# Altium schematic symbol library TI Amplifiers and Linear Special Function Amplifier.SchLib: 708 symbols (part 33 of 34)
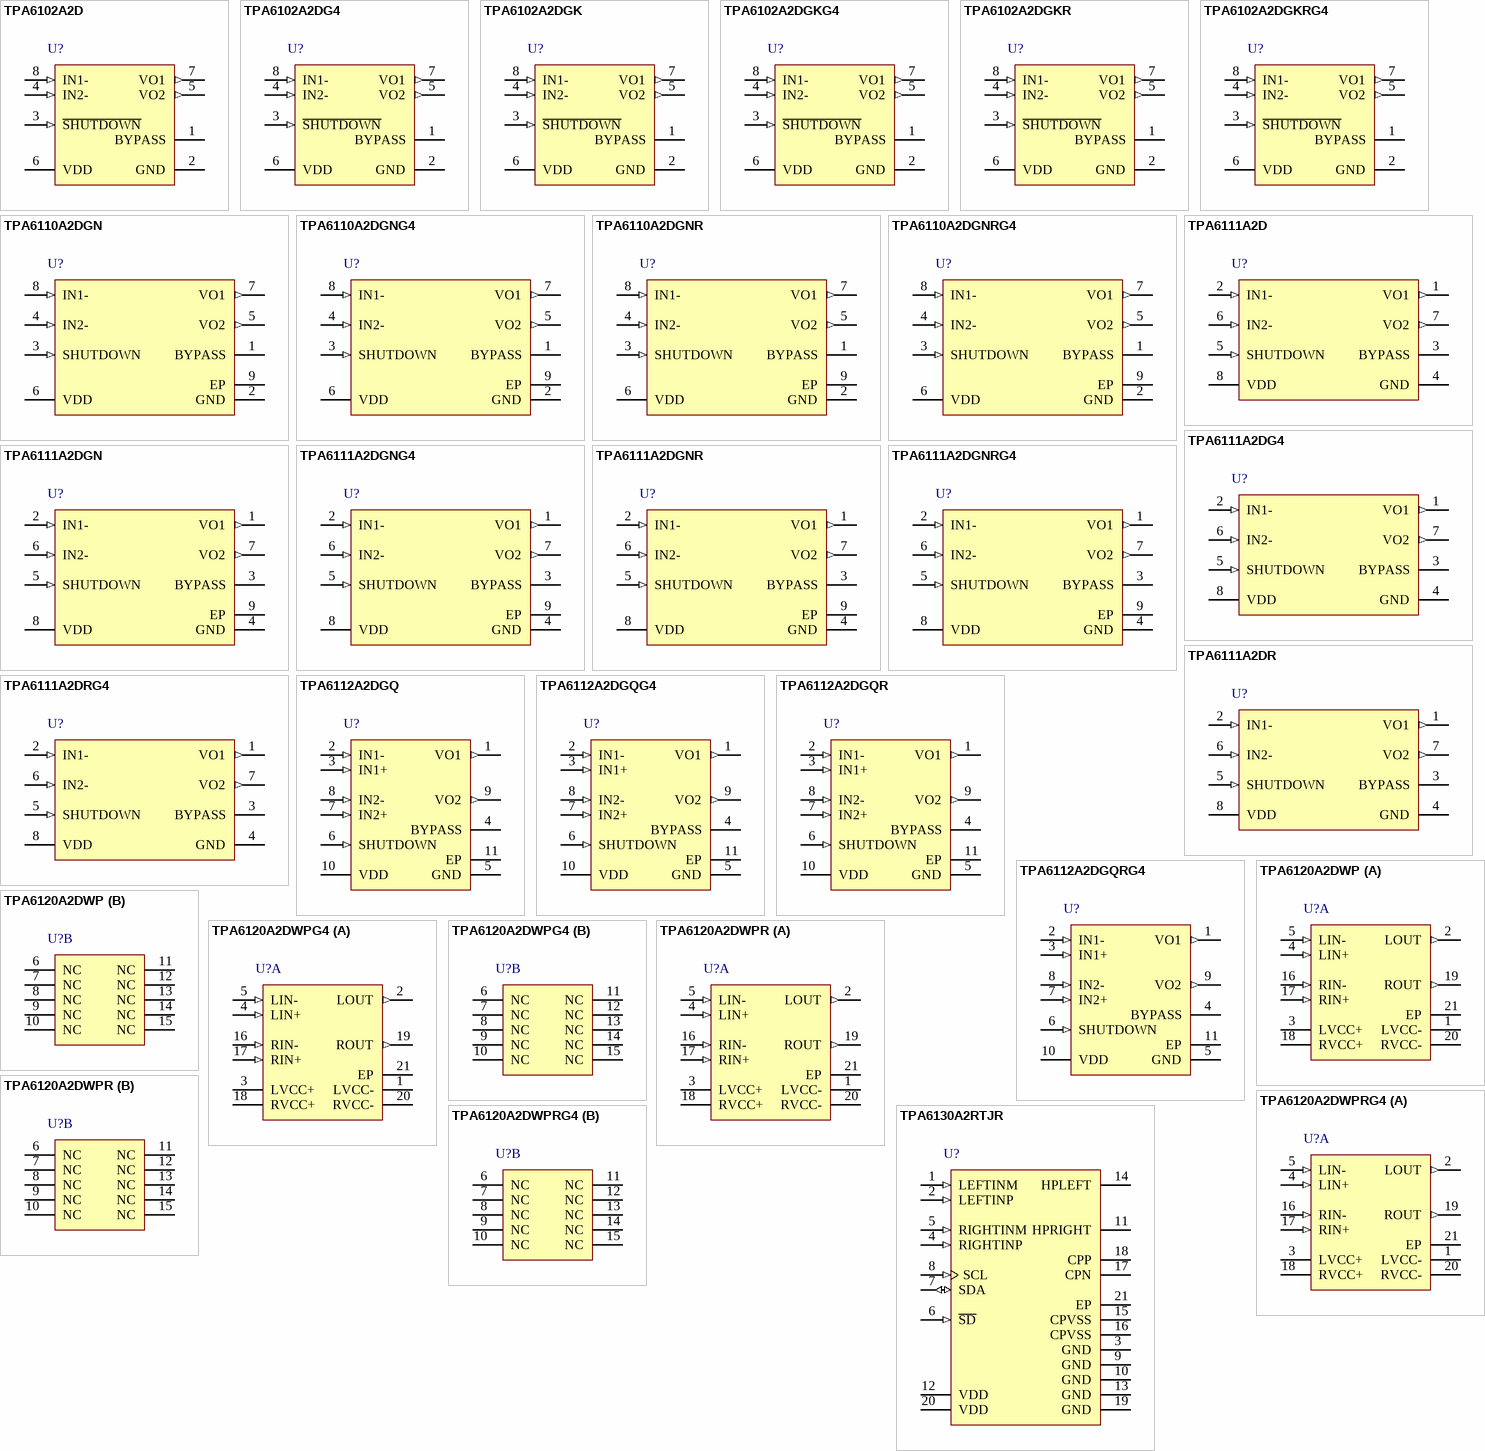
[diagram p71: symbols TPA6102A2D to TPA6130A2RTJR]

## TPA6111A2DRG4
designator U?
150-mW Stereo Headphone Audio Amplifier, Pin Compatible with LM4880 and LM4881, -40 to 85 degC, 8-pin SOIC (D8), Green (RoHS & no Sb/Br); Manufacturer: Texas Instruments; PartNumber: TPA6111A2DRG4; ISD(uA): 1; Load(Min)(ohms): 16; Output Power(W): 0.15; PSRR(dB): 70; SubFamily: Headphone Amplifier; Supply Max(Max)(Volt): 5.5; Supply Min(Min)(Volt): 2.5; DatasheetVersion: SLOS313B; PackageVersion: 4040047-3/M, 06/2011; PackageReference: D8; PackageDescription: 8-Pin Plastic Small Outline, Body 4.9 x 3.9 mm, Pitch 1.27 mm; Supplier 1: Digi-Key; Supplier Part Number 1: TPA6111A2DRG4-ND; Supplier 2: Mouser; Supplier Part Number 2: 595-TPA6111A2DRG4; Eco-Plan: Green (RoHS & no Sb/Br); Headphone Channels: Stereo; Mounting Technology: Surface Mount; Code_JEDEC: MS-012; ComponentLink1Description: Manufacturer URL; ComponentLink1URL: http://www.ti.com/; ComponentLink2Description: Datasheet; ComponentLink2URL: http://www.ti.com/general/docs/lit/getliterature.tsp?genericPartNumber=TPA6111A2&fileType=pdf; ComponentLink3Description: Package Specification; ComponentLink3URL: http://www.ti.com/litv/pdf/msoi002j
footprint TI-D8_N (SOIC, 8-Leads, Body 5x4mm, Pitch 1.27mm, IPC Medium Density)
footprint TI-D8_L (SOIC, 8-Leads, Body 5x4mm, Pitch 1.27mm, IPC High Density)
footprint TI-D8_M (SOIC, 8-Leads, Body 5x4mm, Pitch 1.27mm, IPC Low Density)
pins: 1 VO1 (out) "VO1 is the audio output for channel 1.", 2 IN1- (in) "IN1- is the inverting input for channel 1.", 3 BYPASS "Tap to voltage divider for internal mid-supply bias supply. Connect to a 0.1 uF to 1 uF low ESR capacitor for best performance.", 4 GND (power) "GND is the ground connection.", 5 SHUTDOWN (in) "Puts the device in a low quiescent current mode when held high", 6 IN2- (in) "IN2- is the inverting input for channel 2.", 7 VO2 (out) "VO2 is the audio output for channel 2.", 8 VDD (power) "VDD is the supply voltage terminal."

## TPA6112A2DGQ
designator U?
150-mW Stereo Headphone Audio Amplifier with Differential Input, -40 to 85 degC, 10-pin SOP (DGQ10), Green (RoHS & no Sb/Br); Manufacturer: Texas Instruments; PartNumber: TPA6112A2DGQ; ISD(uA): 10; Load(Min)(ohms): 16; Output Power(W): 0.15; PSRR(dB): 83; SubFamily: Headphone Amplifier; Supply Max(Max)(Volt): 5.5; Supply Min(Min)(Volt): 2.5; DatasheetVersion: SLOS342A; PackageVersion: 4073273/F, 11/2011; PackageReference: DGQ10-1675X1445TP; PackageDescription: 10-Pin Plastic Small Outline, Body 3 x 3 mm, Pitch 0.5 mm; Supplier 1: Digi-Key; Supplier Part Number 1: 296-34560-5-ND; Supplier 2: Newark; Supplier Part Number 2: 76C9849; Supplier 3: Mouser; Supplier Part Number 3: 595-TPA6112A2DGQ; Eco-Plan: Green (RoHS & no Sb/Br); Headphone Channels: Stereo; Mounting Technology: Surface Mount; Code_JEDEC: MO-187; ComponentLink1Description: Manufacturer URL; ComponentLink1URL: http://www.ti.com/; ComponentLink2Description: Datasheet; ComponentLink2URL: http://www.ti.com/general/docs/lit/getliterature.tsp?genericPartNumber=TPA6112A2&fileType=pdf; ComponentLink3Description: Package Specification; ComponentLink3URL: http://www.ti.com/litv/pdf/mpds043e
footprint TI-DGQ10-1675X1445TP_N (SOP, 10-Leads, Body 3.1x3.1mm, Pitch 0.5mm, Thermal Pad 1.88x1.57mm, IPC Medium Density)
footprint TI-DGQ10-1675X1445TP_L (SOP, 10-Leads, Body 3.1x3.1mm, Pitch 0.5mm, Thermal Pad 1.88x1.57mm, IPC High Density)
footprint TI-DGQ10-1675X1445TP_M (SOP, 10-Leads, Body 3.1x3.1mm, Pitch 0.5mm, Thermal Pad 1.88x1.57mm, IPC Low Density)
pins: 1 VO1 (out) "VO1 is the audio output for channel 1.", 2 IN1- (in) "IN1- is the negative input for channel 1.", 3 IN1+ (in) "IN1+ is the positive input for channel 1.", 4 BYPASS "Tap to voltage divider for internal mid-supply bias supply. Connect to a 0.1 uF to 1 uF low ESR capacitor for best performance.", 5 GND (power) "GND is the ground connection.", 6 SHUTDOWN (in) "Puts the device in a low quiescent current mode when held high.", 7 IN2+ (in) "IN2+ is the positive input for channel 2.", 8 IN2- (in) "IN2- is the negative input for channel 2.", 9 VO2 (out) "VO2 is the audio output for channel 2.", 10 VDD (power) "VDD is the supply voltage terminal.", 11 EP

## TPA6112A2DGQG4
designator U?
150-mW Stereo Headphone Audio Amplifier with Differential Input, -40 to 85 degC, 10-pin SOP (DGQ10), Green (RoHS & no Sb/Br); Manufacturer: Texas Instruments; PartNumber: TPA6112A2DGQG4; ISD(uA): 10; Load(Min)(ohms): 16; Output Power(W): 0.15; PSRR(dB): 83; SubFamily: Headphone Amplifier; Supply Max(Max)(Volt): 5.5; Supply Min(Min)(Volt): 2.5; DatasheetVersion: SLOS342A; PackageVersion: 4073273/F, 11/2011; PackageReference: DGQ10-1675X1445TP; PackageDescription: 10-Pin Plastic Small Outline, Body 3 x 3 mm, Pitch 0.5 mm; Supplier 1: Digi-Key; Supplier Part Number 1: TPA6112A2DGQG4-ND; Supplier 2: Newark; Supplier Part Number 2: 54K1505; Supplier 3: Mouser; Supplier Part Number 3: 595-TPA6112A2DGQG4; Eco-Plan: Green (RoHS & no Sb/Br); Headphone Channels: Stereo; Mounting Technology: Surface Mount; Code_JEDEC: MO-187; ComponentLink1Description: Manufacturer URL; ComponentLink1URL: http://www.ti.com/; ComponentLink2Description: Datasheet; ComponentLink2URL: http://www.ti.com/general/docs/lit/getliterature.tsp?genericPartNumber=TPA6112A2&fileType=pdf; ComponentLink3Description: Package Specification; ComponentLink3URL: http://www.ti.com/litv/pdf/mpds043e
footprint TI-DGQ10-1675X1445TP_N (SOP, 10-Leads, Body 3.1x3.1mm, Pitch 0.5mm, Thermal Pad 1.88x1.57mm, IPC Medium Density)
footprint TI-DGQ10-1675X1445TP_L (SOP, 10-Leads, Body 3.1x3.1mm, Pitch 0.5mm, Thermal Pad 1.88x1.57mm, IPC High Density)
footprint TI-DGQ10-1675X1445TP_M (SOP, 10-Leads, Body 3.1x3.1mm, Pitch 0.5mm, Thermal Pad 1.88x1.57mm, IPC Low Density)
pins: 1 VO1 (out) "VO1 is the audio output for channel 1.", 2 IN1- (in) "IN1- is the negative input for channel 1.", 3 IN1+ (in) "IN1+ is the positive input for channel 1.", 4 BYPASS "Tap to voltage divider for internal mid-supply bias supply. Connect to a 0.1 uF to 1 uF low ESR capacitor for best performance.", 5 GND (power) "GND is the ground connection.", 6 SHUTDOWN (in) "Puts the device in a low quiescent current mode when held high.", 7 IN2+ (in) "IN2+ is the positive input for channel 2.", 8 IN2- (in) "IN2- is the negative input for channel 2.", 9 VO2 (out) "VO2 is the audio output for channel 2.", 10 VDD (power) "VDD is the supply voltage terminal.", 11 EP

## TPA6112A2DGQR
designator U?
150-mW Stereo Headphone Audio Amplifier with Differential Input, -40 to 85 degC, 10-pin SOP (DGQ10), Green (RoHS & no Sb/Br); Manufacturer: Texas Instruments; PartNumber: TPA6112A2DGQR; ISD(uA): 10; Load(Min)(ohms): 16; Output Power(W): 0.15; PSRR(dB): 83; SubFamily: Headphone Amplifier; Supply Max(Max)(Volt): 5.5; Supply Min(Min)(Volt): 2.5; DatasheetVersion: SLOS342A; PackageVersion: 4073273/F, 11/2011; PackageReference: DGQ10-1675X1445TP; PackageDescription: 10-Pin Plastic Small Outline, Body 3 x 3 mm, Pitch 0.5 mm; Supplier 1: Digi-Key; Supplier Part Number 1: 296-10848-2-ND; Supplier 2: Digi-Key; Supplier Part Number 2: 296-10848-1-ND; Supplier 3: Digi-Key; Supplier Part Number 3: 296-10848-6-ND; Supplier 4: Newark; Supplier Part Number 4: 76C9850; Supplier 5: Mouser; Supplier Part Number 5: 595-TPA6112A2DGQR; Eco-Plan: Green (RoHS & no Sb/Br); Headphone Channels: Stereo; Mounting Technology: Surface Mount; Code_JEDEC: MO-187; ComponentLink1Description: Manufacturer URL; ComponentLink1URL: http://www.ti.com/; ComponentLink2Description: Datasheet; ComponentLink2URL: http://www.ti.com/general/docs/lit/getliterature.tsp?genericPartNumber=TPA6112A2&fileType=pdf; ComponentLink3Description: Package Specification; ComponentLink3URL: http://www.ti.com/litv/pdf/mpds043e
footprint TI-DGQ10-1675X1445TP_N (SOP, 10-Leads, Body 3.1x3.1mm, Pitch 0.5mm, Thermal Pad 1.88x1.57mm, IPC Medium Density)
footprint TI-DGQ10-1675X1445TP_L (SOP, 10-Leads, Body 3.1x3.1mm, Pitch 0.5mm, Thermal Pad 1.88x1.57mm, IPC High Density)
footprint TI-DGQ10-1675X1445TP_M (SOP, 10-Leads, Body 3.1x3.1mm, Pitch 0.5mm, Thermal Pad 1.88x1.57mm, IPC Low Density)
pins: 1 VO1 (out) "VO1 is the audio output for channel 1.", 2 IN1- (in) "IN1- is the negative input for channel 1.", 3 IN1+ (in) "IN1+ is the positive input for channel 1.", 4 BYPASS "Tap to voltage divider for internal mid-supply bias supply. Connect to a 0.1 uF to 1 uF low ESR capacitor for best performance.", 5 GND (power) "GND is the ground connection.", 6 SHUTDOWN (in) "Puts the device in a low quiescent current mode when held high.", 7 IN2+ (in) "IN2+ is the positive input for channel 2.", 8 IN2- (in) "IN2- is the negative input for channel 2.", 9 VO2 (out) "VO2 is the audio output for channel 2.", 10 VDD (power) "VDD is the supply voltage terminal.", 11 EP

## TPA6112A2DGQRG4
designator U?
150-mW Stereo Headphone Audio Amplifier with Differential Input, -40 to 85 degC, 10-pin SOP (DGQ10), Green (RoHS & no Sb/Br); Manufacturer: Texas Instruments; PartNumber: TPA6112A2DGQRG4; ISD(uA): 10; Load(Min)(ohms): 16; Output Power(W): 0.15; PSRR(dB): 83; SubFamily: Headphone Amplifier; Supply Max(Max)(Volt): 5.5; Supply Min(Min)(Volt): 2.5; DatasheetVersion: SLOS342A; PackageVersion: 4073273/F, 11/2011; PackageReference: DGQ10-1675X1445TP; PackageDescription: 10-Pin Plastic Small Outline, Body 3 x 3 mm, Pitch 0.5 mm; Supplier 1: Digi-Key; Supplier Part Number 1: TPA6112A2DGQRG4-ND; Supplier 2: Newark; Supplier Part Number 2: 73J8374; Supplier 3: Mouser; Supplier Part Number 3: 595-TPA6112A2DGQRG4; Eco-Plan: Green (RoHS & no Sb/Br); Headphone Channels: Stereo; Mounting Technology: Surface Mount; Code_JEDEC: MO-187; ComponentLink1Description: Manufacturer URL; ComponentLink1URL: http://www.ti.com/; ComponentLink2Description: Datasheet; ComponentLink2URL: http://www.ti.com/general/docs/lit/getliterature.tsp?genericPartNumber=TPA6112A2&fileType=pdf; ComponentLink3Description: Package Specification; ComponentLink3URL: http://www.ti.com/litv/pdf/mpds043e
footprint TI-DGQ10-1675X1445TP_N (SOP, 10-Leads, Body 3.1x3.1mm, Pitch 0.5mm, Thermal Pad 1.88x1.57mm, IPC Medium Density)
footprint TI-DGQ10-1675X1445TP_L (SOP, 10-Leads, Body 3.1x3.1mm, Pitch 0.5mm, Thermal Pad 1.88x1.57mm, IPC High Density)
footprint TI-DGQ10-1675X1445TP_M (SOP, 10-Leads, Body 3.1x3.1mm, Pitch 0.5mm, Thermal Pad 1.88x1.57mm, IPC Low Density)
pins: 1 VO1 (out) "VO1 is the audio output for channel 1.", 2 IN1- (in) "IN1- is the negative input for channel 1.", 3 IN1+ (in) "IN1+ is the positive input for channel 1.", 4 BYPASS "Tap to voltage divider for internal mid-supply bias supply. Connect to a 0.1 uF to 1 uF low ESR capacitor for best performance.", 5 GND (power) "GND is the ground connection.", 6 SHUTDOWN (in) "Puts the device in a low quiescent current mode when held high.", 7 IN2+ (in) "IN2+ is the positive input for channel 2.", 8 IN2- (in) "IN2- is the negative input for channel 2.", 9 VO2 (out) "VO2 is the audio output for channel 2.", 10 VDD (power) "VDD is the supply voltage terminal.", 11 EP

## TPA6120A2DWP
designator U?
High Fidelity Stereo Headphone Amplifier, -40 to 85 degC, 20-pin SOP (DWP20), Green (RoHS & no Sb/Br); Manufacturer: Texas Instruments; PartNumber: TPA6120A2DWP; Load(Min)(ohms): 16; PSRR(dB): 75; Special Features: Hi-Fi; Supply Max(Max)(Volt): 30; Supply Min(Min)(Volt): 10; Volume Control: Yes; DatasheetVersion: SLOS431; PackageVersion: 4147575/C, 02/2005; PackageReference: DWP20-3730X2350TP; PackageDescription: 20-Pin PowerPAD(TM) Plastic Small-Outline Package, Body 12.825 x 7.52 mm, Pitch 1.27 mm; Supplier 1: Digi-Key; Supplier Part Number 1: 296-16920-5-ND; Supplier 2: Newark; Supplier Part Number 2: 01J0948; Supplier 3: Mouser; Supplier Part Number 3: 595-TPA6120A2DWP; Eco-Plan: Green (RoHS & no Sb/Br); Headphone Channels: Stereo; SubFamily: Headphone Amplifier; Mounting Technology: Surface Mount; ComponentLink1Description: Manufacturer URL; ComponentLink1URL: http://www.ti.com/; ComponentLink2Description: Datasheet; ComponentLink2URL: http://www.ti.com/general/docs/lit/getliterature.tsp?genericPartNumber=TPA6120A2&fileType=pdf; ComponentLink3Description: Package Specification; ComponentLink3URL: http://www.ti.com/litv/pdf/mpds032b
footprint TI-DWP20-3730X2350TP_N (SOP, 20-Leads, Body 12.825x7.52mm, Pitch 1.27mm, Thermal Pad 3.47X2.35mm, IPC Medium Density)
footprint TI-DWP20-3730X2350TP_L (SOP, 20-Leads, Body 12.825x7.52mm, Pitch 1.27mm, Thermal Pad 3.47X2.35mm, IPC High Density)
footprint TI-DWP20-3730X2350TP_M (SOP, 20-Leads, Body 12.825x7.52mm, Pitch 1.27mm, Thermal Pad 3.47X2.35mm, IPC Low Density)
part A pins: 1 LVCC- (power) "Left channel negative power supply - must be kept at the same potential as RVCC-.", 2 LOUT (out) "Left channel output", 3 LVCC+ (power) "Left channel positive power supply", 4 LIN+ (in) "Left channel positive input", 5 LIN- (in) "Left channel negative input", 16 RIN- (in) "Right channel negative input", 17 RIN+ (in) "Right channel positive input", 18 RVCC+ (power) "Right channel positive power supply", 19 ROUT (out) "Right channel output", 20 RVCC- (power) "Right channel negative power supply - must be kept at the same potential as LVCC-.", 21 EP (power) "Connect to ground. The thermal pad must be soldered down in all applications to properly secure device on the PCB."
part B pins: 6 NC "Not internally connected", 7 NC "Not internally connected", 8 NC "Not internally connected", 9 NC "Not internally connected", 10 NC "Not internally connected", 11 NC "Not internally connected", 12 NC "Not internally connected", 13 NC "Not internally connected", 14 NC "Not internally connected", 15 NC "Not internally connected"

## TPA6120A2DWPG4
designator U?
High Fidelity Stereo Headphone Amplifier, -40 to 85 degC, 20-pin SOP (DWP20), Green (RoHS & no Sb/Br); Manufacturer: Texas Instruments; PartNumber: TPA6120A2DWPG4; Load(Min)(ohms): 16; PSRR(dB): 75; Special Features: Hi-Fi; Supply Max(Max)(Volt): 30; Supply Min(Min)(Volt): 10; Volume Control: Yes; DatasheetVersion: SLOS431; PackageVersion: 4147575/C, 02/2005; PackageReference: DWP20-3730X2350TP; PackageDescription: 20-Pin PowerPAD(TM) Plastic Small-Outline Package, Body 12.825 x 7.52 mm, Pitch 1.27 mm; Supplier 1: Digi-Key; Supplier Part Number 1: 296-36165-5-ND; Supplier 2: Farnell; Supplier Part Number 2: 1207315; Supplier 3: Newark; Supplier Part Number 3: 24M8504; Supplier 4: Newark; Supplier Part Number 4: 85K1674; Supplier 5: Mouser; Supplier Part Number 5: 595-TPA6120A2DWPG4; Eco-Plan: Green (RoHS & no Sb/Br); Headphone Channels: Stereo; SubFamily: Headphone Amplifier; Mounting Technology: Surface Mount; ComponentLink1Description: Manufacturer URL; ComponentLink1URL: http://www.ti.com/; ComponentLink2Description: Datasheet; ComponentLink2URL: http://www.ti.com/general/docs/lit/getliterature.tsp?genericPartNumber=TPA6120A2&fileType=pdf; ComponentLink3Description: Package Specification; ComponentLink3URL: http://www.ti.com/litv/pdf/mpds032b
footprint TI-DWP20-3730X2350TP_N (SOP, 20-Leads, Body 12.825x7.52mm, Pitch 1.27mm, Thermal Pad 3.47X2.35mm, IPC Medium Density)
footprint TI-DWP20-3730X2350TP_L (SOP, 20-Leads, Body 12.825x7.52mm, Pitch 1.27mm, Thermal Pad 3.47X2.35mm, IPC High Density)
footprint TI-DWP20-3730X2350TP_M (SOP, 20-Leads, Body 12.825x7.52mm, Pitch 1.27mm, Thermal Pad 3.47X2.35mm, IPC Low Density)
part A pins: 1 LVCC- (power) "Left channel negative power supply - must be kept at the same potential as RVCC-.", 2 LOUT (out) "Left channel output", 3 LVCC+ (power) "Left channel positive power supply", 4 LIN+ (in) "Left channel positive input", 5 LIN- (in) "Left channel negative input", 16 RIN- (in) "Right channel negative input", 17 RIN+ (in) "Right channel positive input", 18 RVCC+ (power) "Right channel positive power supply", 19 ROUT (out) "Right channel output", 20 RVCC- (power) "Right channel negative power supply - must be kept at the same potential as LVCC-.", 21 EP (power) "Connect to ground. The thermal pad must be soldered down in all applications to properly secure device on the PCB."
part B pins: 6 NC "Not internally connected", 7 NC "Not internally connected", 8 NC "Not internally connected", 9 NC "Not internally connected", 10 NC "Not internally connected", 11 NC "Not internally connected", 12 NC "Not internally connected", 13 NC "Not internally connected", 14 NC "Not internally connected", 15 NC "Not internally connected"

## TPA6120A2DWPR
designator U?
High Fidelity Stereo Headphone Amplifier, -40 to 85 degC, 20-pin SOP (DWP20), Green (RoHS & no Sb/Br); Manufacturer: Texas Instruments; PartNumber: TPA6120A2DWPR; Load(Min)(ohms): 16; PSRR(dB): 75; Special Features: Hi-Fi; Supply Max(Max)(Volt): 30; Supply Min(Min)(Volt): 10; Volume Control: Yes; DatasheetVersion: SLOS431; PackageVersion: 4147575/C, 02/2005; PackageReference: DWP20-3730X2350TP; PackageDescription: 20-Pin PowerPAD(TM) Plastic Small-Outline Package, Body 12.825 x 7.52 mm, Pitch 1.27 mm; Supplier 1: Digi-Key; Supplier Part Number 1: TPA6120A2DWPR-ND; Supplier 2: Newark; Supplier Part Number 2: 01J0949; Supplier 3: Mouser; Supplier Part Number 3: 595-TPA6120A2DWPR; Eco-Plan: Green (RoHS & no Sb/Br); Headphone Channels: Stereo; SubFamily: Headphone Amplifier; Mounting Technology: Surface Mount; ComponentLink1Description: Manufacturer URL; ComponentLink1URL: http://www.ti.com/; ComponentLink2Description: Datasheet; ComponentLink2URL: http://www.ti.com/general/docs/lit/getliterature.tsp?genericPartNumber=TPA6120A2&fileType=pdf; ComponentLink3Description: Package Specification; ComponentLink3URL: http://www.ti.com/litv/pdf/mpds032b
footprint TI-DWP20-3730X2350TP_N (SOP, 20-Leads, Body 12.825x7.52mm, Pitch 1.27mm, Thermal Pad 3.47X2.35mm, IPC Medium Density)
footprint TI-DWP20-3730X2350TP_L (SOP, 20-Leads, Body 12.825x7.52mm, Pitch 1.27mm, Thermal Pad 3.47X2.35mm, IPC High Density)
footprint TI-DWP20-3730X2350TP_M (SOP, 20-Leads, Body 12.825x7.52mm, Pitch 1.27mm, Thermal Pad 3.47X2.35mm, IPC Low Density)
part A pins: 1 LVCC- (power) "Left channel negative power supply - must be kept at the same potential as RVCC-.", 2 LOUT (out) "Left channel output", 3 LVCC+ (power) "Left channel positive power supply", 4 LIN+ (in) "Left channel positive input", 5 LIN- (in) "Left channel negative input", 16 RIN- (in) "Right channel negative input", 17 RIN+ (in) "Right channel positive input", 18 RVCC+ (power) "Right channel positive power supply", 19 ROUT (out) "Right channel output", 20 RVCC- (power) "Right channel negative power supply - must be kept at the same potential as LVCC-.", 21 EP (power) "Connect to ground. The thermal pad must be soldered down in all applications to properly secure device on the PCB."
part B pins: 6 NC "Not internally connected", 7 NC "Not internally connected", 8 NC "Not internally connected", 9 NC "Not internally connected", 10 NC "Not internally connected", 11 NC "Not internally connected", 12 NC "Not internally connected", 13 NC "Not internally connected", 14 NC "Not internally connected", 15 NC "Not internally connected"

## TPA6120A2DWPRG4
designator U?
High Fidelity Stereo Headphone Amplifier, -40 to 85 degC, 20-pin SOP (DWP20), Green (RoHS & no Sb/Br); Manufacturer: Texas Instruments; PartNumber: TPA6120A2DWPRG4; Load(Min)(ohms): 16; PSRR(dB): 75; Special Features: Hi-Fi; Supply Max(Max)(Volt): 30; Supply Min(Min)(Volt): 10; Volume Control: Yes; DatasheetVersion: SLOS431; PackageVersion: 4147575/C, 02/2005; PackageReference: DWP20-3730X2350TP; PackageDescription: 20-Pin PowerPAD(TM) Plastic Small-Outline Package, Body 12.825 x 7.52 mm, Pitch 1.27 mm; Supplier 1: Digi-Key; Supplier Part Number 1: TPA6120A2DWPRG4-ND; Supplier 2: Mouser; Supplier Part Number 2: 595-TPA6120A2DWPRG4; Eco-Plan: Green (RoHS & no Sb/Br); Headphone Channels: Stereo; SubFamily: Headphone Amplifier; Mounting Technology: Surface Mount; ComponentLink1Description: Manufacturer URL; ComponentLink1URL: http://www.ti.com/; ComponentLink2Description: Datasheet; ComponentLink2URL: http://www.ti.com/general/docs/lit/getliterature.tsp?genericPartNumber=TPA6120A2&fileType=pdf; ComponentLink3Description: Package Specification; ComponentLink3URL: http://www.ti.com/litv/pdf/mpds032b
footprint TI-DWP20-3730X2350TP_N (SOP, 20-Leads, Body 12.825x7.52mm, Pitch 1.27mm, Thermal Pad 3.47X2.35mm, IPC Medium Density)
footprint TI-DWP20-3730X2350TP_L (SOP, 20-Leads, Body 12.825x7.52mm, Pitch 1.27mm, Thermal Pad 3.47X2.35mm, IPC High Density)
footprint TI-DWP20-3730X2350TP_M (SOP, 20-Leads, Body 12.825x7.52mm, Pitch 1.27mm, Thermal Pad 3.47X2.35mm, IPC Low Density)
part A pins: 1 LVCC- (power) "Left channel negative power supply - must be kept at the same potential as RVCC-.", 2 LOUT (out) "Left channel output", 3 LVCC+ (power) "Left channel positive power supply", 4 LIN+ (in) "Left channel positive input", 5 LIN- (in) "Left channel negative input", 16 RIN- (in) "Right channel negative input", 17 RIN+ (in) "Right channel positive input", 18 RVCC+ (power) "Right channel positive power supply", 19 ROUT (out) "Right channel output", 20 RVCC- (power) "Right channel negative power supply - must be kept at the same potential as LVCC-.", 21 EP (power) "Connect to ground. The thermal pad must be soldered down in all applications to properly secure device on the PCB."
part B pins: 6 NC "Not internally connected", 7 NC "Not internally connected", 8 NC "Not internally connected", 9 NC "Not internally connected", 10 NC "Not internally connected", 11 NC "Not internally connected", 12 NC "Not internally connected", 13 NC "Not internally connected", 14 NC "Not internally connected", 15 NC "Not internally connected"

## TPA6130A2RTJR
designator U?
138-mW DirectPath(TM) Stereo Headphone Amplifier with I2C Volume Control, -40 to 85 degC, 20-pin QFN (RTJ20), Green (RoHS & no Sb/Br); Manufacturer: Texas Instruments; PartNumber: TPA6130A2RTJR; Ground-Centered Outputs: Yes; Half Power THD + N @ 1 kHz (%)(kHz): 0.0055; ISD(uA): 0.4; Load(Min)(ohms): 16; Output Power(W): 0.138; PSRR(dB): -109; Supply Max(Max)(Volt): 5.5; Supply Min(Min)(Volt): 2.5; DatasheetVersion: SLOS488B; PackageVersion: 4205505/F, 07/2011; PackageReference: RTJ20-2700X2700TP; PackageDescription: 20-pin Plastic Flat Pack, Body 4 x 4 mm, Pitch 0.5 mm; Supplier 1: Digi-Key; Supplier Part Number 1: 296-21656-2-ND; Supplier 2: Digi-Key; Supplier Part Number 2: 296-21656-1-ND; Supplier 3: Digi-Key; Supplier Part Number 3: 296-21656-6-ND; Supplier 4: Farnell; Supplier Part Number 4: 1697156; Supplier 5: Newark; Supplier Part Number 5: 34M0132; Supplier 6: Newark; Supplier Part Number 6: 28X4490; Supplier 7: Mouser; Supplier Part Number 7: 595-TPA6130A2RTJR; Eco-Plan: Green (RoHS & no Sb/Br); Headphone Channels: Stereo; SubFamily: Headphone Amplifier; Volume Control: Yes; Mounting Technology: Surface Mount; ComponentLink1Description: Manufacturer URL; ComponentLink1URL: http://www.ti.com/; ComponentLink2Description: Datasheet; ComponentLink2URL: http://www.ti.com/general/docs/lit/getliterature.tsp?genericPartNumber=TPA6130A2&fileType=pdf; ComponentLink3Description: Package Specification; ComponentLink3URL: http://www.ti.com/litv/pdf/mpqf156e
footprint TI-RTJ20-2700X2700TP_V (QFN, 20-Leads, Body 4x4mm, Pitch 0.5mm, Thermal Pad 2.7x2.7mm)
pins: 1 LEFTINM (in) "Left channel negative differential input. Impedance must be matched to LEFTINP. Connect the left input to LEFTINM when using single-ended inputs.", 2 LEFTINP (in) "Left channel positive differential input. Impedance must be matched to LEFTINM. AC ground LEFTINP near signal source while maintaining matched impedance to LEFTINM when using single-ended inputs.", 3 GND (power) "Analog ground. Must be connected to common supply GND. It is recommended that this pin be used to decouple VDD for analog. Use pin 13 to decouple pin 12 on the QFN package.", 4 RIGHTINP (in) "Right channel positive differential input. Impedance must be matched to RIGHTINM. AC ground RIGHTINP near signal source while maintaining matched impedance to RIGHTINM when using single-ended inputs.", 5 RIGHTINM (in) "Right channel negative differential input. Impedance must be matched to RIGHTINP. Connect the right input to RIGHTINM when using single-ended inputs.", 6 ~{SD} (in) "Shutdown. Active low logic. 5V tolerant input.", 7 SDA (io) "SDA - I2C Data. 5V tolerant input.", 8 SCL (in) "SCL - I2C Clock. 5V tolerant input.", 9 GND (power) "Analog ground. Must be connected to common supply GND. It is recommended that this pin be used to decouple VDD for analog. Use pin 13 to decouple pin 12 on the QFN package.", 10 GND (power) "Analog ground. Must be connected to common supply GND. It is recommended that this pin be used to decouple VDD for analog. Use pin 13 to decouple pin 12 on the QFN package.", 11 HPRIGHT (hiz) "Headphone light channel output. Connect to the right terminal of the headphone jack.", 12 VDD (power) "Analog VDD. VDD must be connected to common VDD supply. Decouple with its own 1-uf capacitor to analog ground (pin 13 on the QFN).", 13 GND (power) "Analog ground. Must be connected to common supply GND. It is recommended that this pin be used to decouple VDD for analog. Use pin 13 to decouple pin 12 on the QFN package.", 14 HPLEFT (hiz) "Headphone left channel output. Connect to left terminal of headphone jack.", 15 CPVSS (power) "Negative supply generated by the charge pump. Decouple to pin 19 on the QFN or a GND plane. Use a 1 uF capacitor.", 16 CPVSS (power) "Negative supply generated by the charge pump. Decouple to pin 19 on the QFN or a GND plane. Use a 1 uF capacitor.", 17 CPN "Charge pump flying capacitor negative terminal. Connect one side of the flying capacitor to CPN.", 18 CPP "Charge pump flying capacitor positive terminal. Connect one side of the flying capacitor to CPP.", 19 GND (power) "Charge pump ground. GND must be connected to common supply GND. It is recommended that this pin be decoupled to the VDD of the charge pump pin (pin 20 on the QFN).", 20 VDD (power) "Charge pump voltage supply. VDD must be connected to the common VDD voltage supply. Decouple to GND (pin 19 on the QFN) with its own 1 uF capacitor.", 21 EP (power) "Solder the thermal pad on the bottom of the QFN package to the GND plane of the PCB. It is required for mechanical stability and will enhance thermal performance."

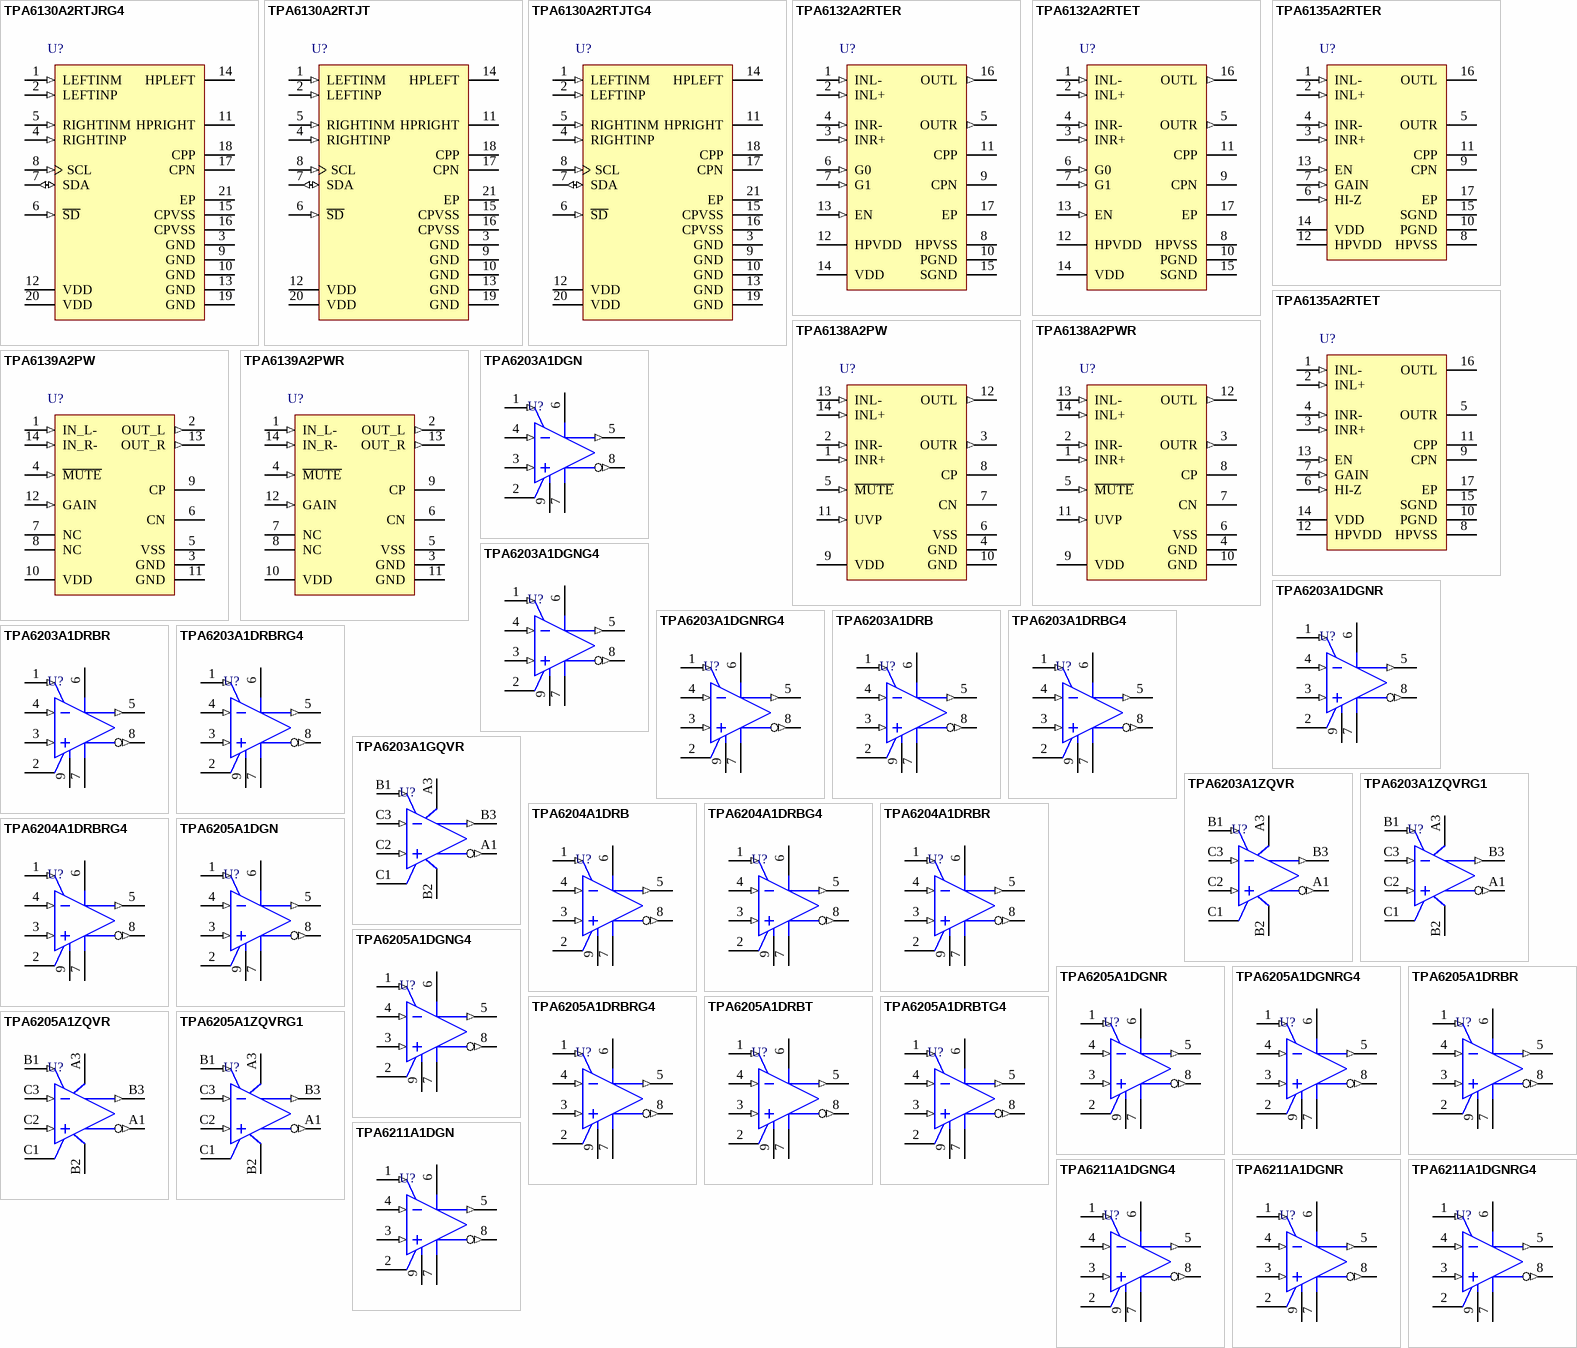
[diagram p38: symbols TPA6130A2RTJRG4 to TPA6211A1DGNRG4]

## TPA6130A2RTJRG4
designator U?
138-mW DirectPath(TM) Stereo Headphone Amplifier with I2C Volume Control, -40 to 85 degC, 20-pin QFN (RTJ20), Green (RoHS & no Sb/Br); Manufacturer: Texas Instruments; PartNumber: TPA6130A2RTJRG4; Ground-Centered Outputs: Yes; Half Power THD + N @ 1 kHz (%)(kHz): 0.0055; ISD(uA): 0.4; Load(Min)(ohms): 16; Output Power(W): 0.138; PSRR(dB): -109; Supply Max(Max)(Volt): 5.5; Supply Min(Min)(Volt): 2.5; DatasheetVersion: SLOS488B; PackageVersion: 4205505/F, 07/2011; PackageReference: RTJ20-2700X2700TP; PackageDescription: 20-pin Plastic Flat Pack, Body 4 x 4 mm, Pitch 0.5 mm; Supplier 1: Digi-Key; Supplier Part Number 1: TPA6130A2RTJRG4-ND; Supplier 2: Newark; Supplier Part Number 2: 41M5837; Supplier 3: Mouser; Supplier Part Number 3: 595-TPA6130A2RTJRG4; Eco-Plan: Green (RoHS & no Sb/Br); Headphone Channels: Stereo; SubFamily: Headphone Amplifier; Volume Control: Yes; Mounting Technology: Surface Mount; ComponentLink1Description: Manufacturer URL; ComponentLink1URL: http://www.ti.com/; ComponentLink2Description: Datasheet; ComponentLink2URL: http://www.ti.com/general/docs/lit/getliterature.tsp?genericPartNumber=TPA6130A2&fileType=pdf; ComponentLink3Description: Package Specification; ComponentLink3URL: http://www.ti.com/litv/pdf/mpqf156e
footprint TI-RTJ20-2700X2700TP_V (QFN, 20-Leads, Body 4x4mm, Pitch 0.5mm, Thermal Pad 2.7x2.7mm)
pins: 1 LEFTINM (in) "Left channel negative differential input. Impedance must be matched to LEFTINP. Connect the left input to LEFTINM when using single-ended inputs.", 2 LEFTINP (in) "Left channel positive differential input. Impedance must be matched to LEFTINM. AC ground LEFTINP near signal source while maintaining matched impedance to LEFTINM when using single-ended inputs.", 3 GND (power) "Analog ground. Must be connected to common supply GND. It is recommended that this pin be used to decouple VDD for analog. Use pin 13 to decouple pin 12 on the QFN package.", 4 RIGHTINP (in) "Right channel positive differential input. Impedance must be matched to RIGHTINM. AC ground RIGHTINP near signal source while maintaining matched impedance to RIGHTINM when using single-ended inputs.", 5 RIGHTINM (in) "Right channel negative differential input. Impedance must be matched to RIGHTINP. Connect the right input to RIGHTINM when using single-ended inputs.", 6 ~{SD} (in) "Shutdown. Active low logic. 5V tolerant input.", 7 SDA (io) "SDA - I2C Data. 5V tolerant input.", 8 SCL (in) "SCL - I2C Clock. 5V tolerant input.", 9 GND (power) "Analog ground. Must be connected to common supply GND. It is recommended that this pin be used to decouple VDD for analog. Use pin 13 to decouple pin 12 on the QFN package.", 10 GND (power) "Analog ground. Must be connected to common supply GND. It is recommended that this pin be used to decouple VDD for analog. Use pin 13 to decouple pin 12 on the QFN package.", 11 HPRIGHT (hiz) "Headphone light channel output. Connect to the right terminal of the headphone jack.", 12 VDD (power) "Analog VDD. VDD must be connected to common VDD supply. Decouple with its own 1-uf capacitor to analog ground (pin 13 on the QFN).", 13 GND (power) "Analog ground. Must be connected to common supply GND. It is recommended that this pin be used to decouple VDD for analog. Use pin 13 to decouple pin 12 on the QFN package.", 14 HPLEFT (hiz) "Headphone left channel output. Connect to left terminal of headphone jack.", 15 CPVSS (power) "Negative supply generated by the charge pump. Decouple to pin 19 on the QFN or a GND plane. Use a 1 uF capacitor.", 16 CPVSS (power) "Negative supply generated by the charge pump. Decouple to pin 19 on the QFN or a GND plane. Use a 1 uF capacitor.", 17 CPN "Charge pump flying capacitor negative terminal. Connect one side of the flying capacitor to CPN.", 18 CPP "Charge pump flying capacitor positive terminal. Connect one side of the flying capacitor to CPP.", 19 GND (power) "Charge pump ground. GND must be connected to common supply GND. It is recommended that this pin be decoupled to the VDD of the charge pump pin (pin 20 on the QFN).", 20 VDD (power) "Charge pump voltage supply. VDD must be connected to the common VDD voltage supply. Decouple to GND (pin 19 on the QFN) with its own 1 uF capacitor.", 21 EP (power) "Solder the thermal pad on the bottom of the QFN package to the GND plane of the PCB. It is required for mechanical stability and will enhance thermal performance."
